# Altium footprint library SAWACO.PcbLib: 45 footprints (part 3 of 3)
Each footprint in its own frame and in the unit in brackets; x right, y up, seen from the top. Pads: shape width x height; smd on the part's side, far side on the other; paste and mask are expansions set on the pad; w line width, h text height; cw(c..) or ccw(c..) is an arc to the next point about the centre after c.
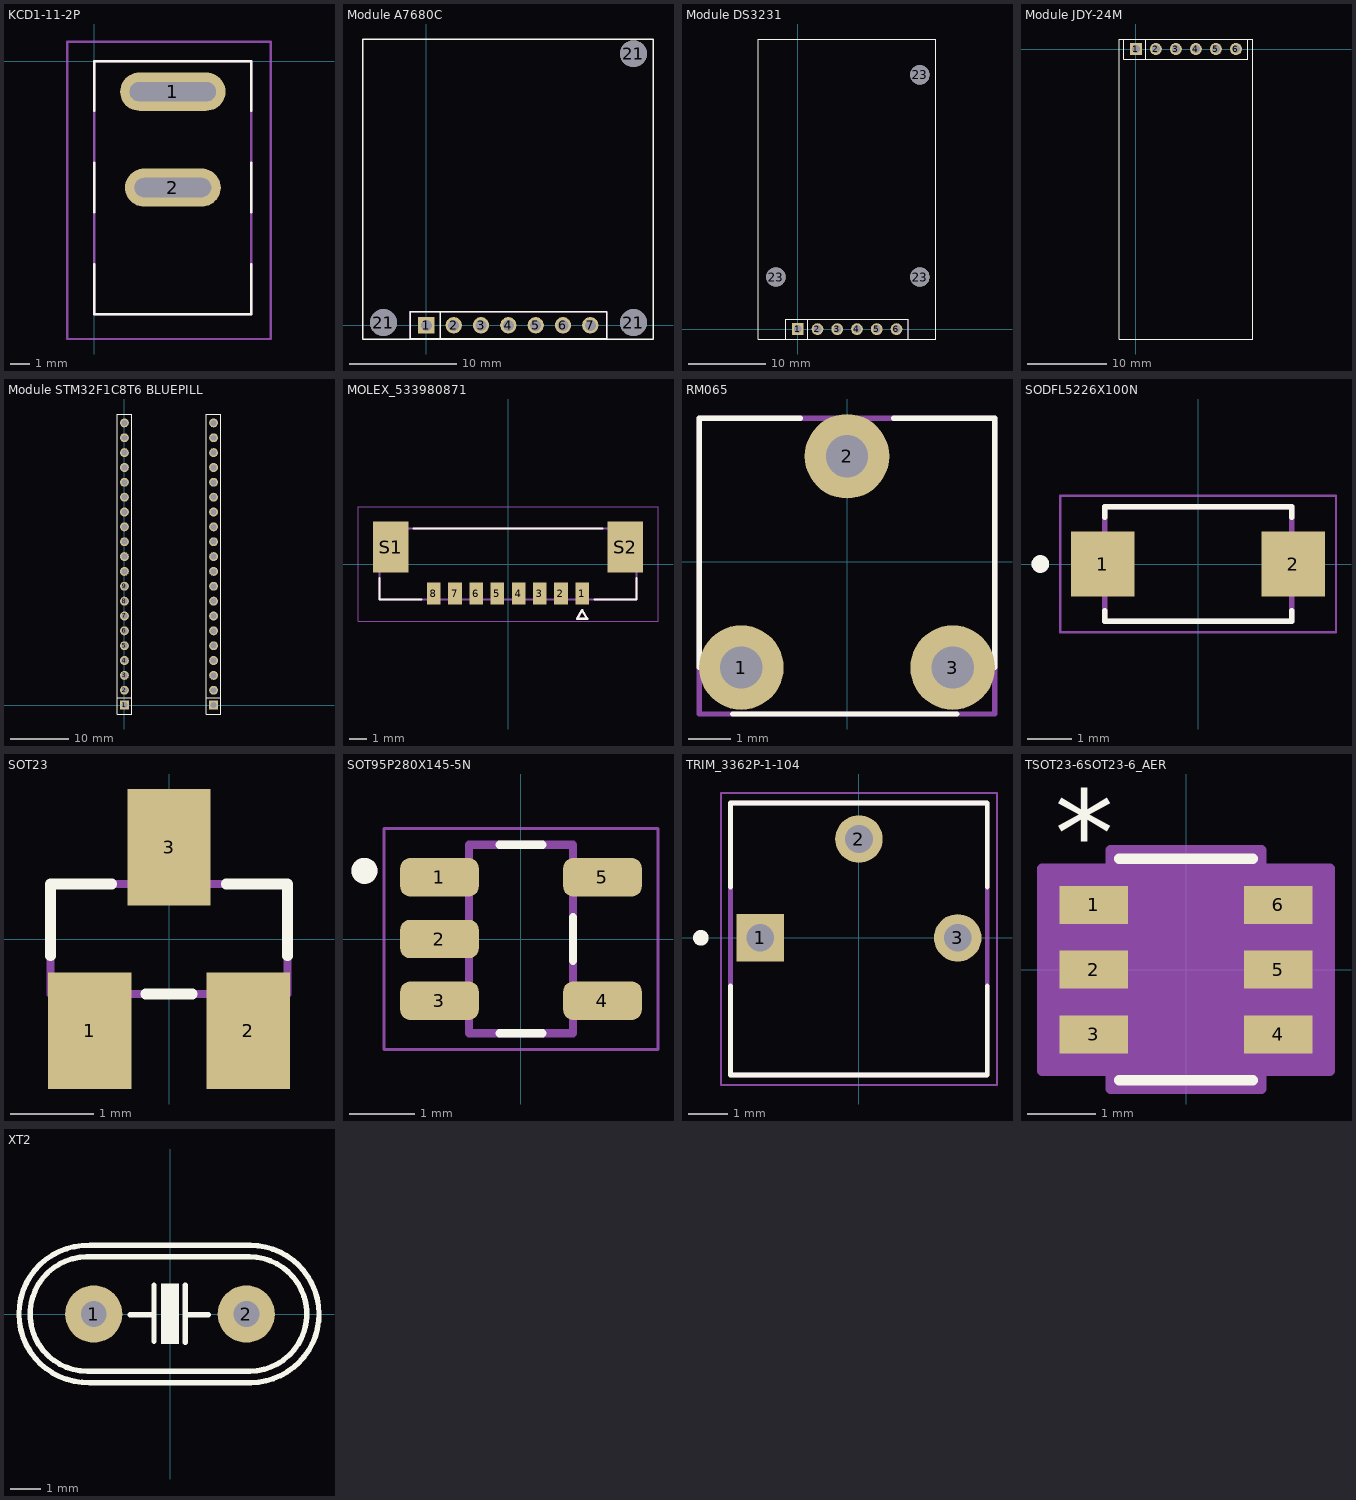
[diagram p2: the footprints below, top view; thin cyan lines are the x and y axes]

## KCD1-11-2P [mm] "KCD1-11 power switch"
pads (2):
  oval 5.5x2 hole 1 slot 4.5 at 0 deg: 1(4.1,-1.6)
  oval 5x2 hole 1 slot 4 at 0 deg: 2(4.1,-6.6)
Top Overlay:
  lines w0.127: 0,-10.6 0,-13.2 8.2,-13.2 8.2,-10.6 ; 0,-7.9 0,-5.3 ; 0,-2.6 0,0 8.2,0 8.2,-2.6 ; 8.2,-7.9 8.2,-5.3
Mechanical 13:
  lines w0.127: 0,-13.2 8.2,-13.2 8.2,0 0,0 0,-13.2
Mechanical 15:
  lines w0.127: -1.4,-14.5 9.2,-14.5 9.2,1 -1.4,1 -1.4,-14.5
3D body "KCD1-11.step": height 14.5, standoff -5, extent -1.3,-14.5 9.1,1

## Module A7680C [mm] "Footprint for A7680C"
height 8.5
pads (10):
  rect 1.52x1.52 hole 1.02: 1(0,0)
  round 1.52 hole 1.02: 2(2.54,0) 3(5.08,0) 4(7.62,0) 5(10.16,0) 6(12.7,0) 7(15.24,0)
  round 2.5 hole 2.5: 21(-4,0.25) 21(19.25,0.25) 21(19.25,25.25)
Top Overlay:
  lines w0.127: -1.524,-1.27 16.764,-1.27 16.764,1.27 -1.524,1.27 ; -1.52,-1.27 -1.52,1.27 ; 1.27,-1.27 1.27,1.27 ; -5.898,-1.275 21.075,-1.275 21.075,26.618 -5.898,26.618 -5.898,-1.275
Mechanical 15:
  lines w0.127: -1.524,-1.27 -1.524,1.27 16.764,1.27 16.764,-1.27 -1.524,-1.27
3D body "Module A7680C THUDUC No-Volte v6.step": height 12.01, standoff 0.47, extent -5.875,-1.275 21.125,26.725

## Module DS3231 [mm]
height 8.5
pads (9):
  rect 1.52x1.52 hole 1.02: 1(0,0)
  round 1.52 hole 1.02: 2(2.54,0) 3(5.08,0) 4(7.62,0) 5(10.16,0) 6(12.7,0)
  round 2.5 hole 2.5: 23(-2.8,6.7) 23(15.7,6.7) 23(15.7,32.7)
Top Overlay:
  lines w0.127: -1.524,-1.27 14.224,-1.27 14.224,1.27 ; -1.524,1.27 14.224,1.27 ; -1.52,-1.27 -1.52,1.27 ; 1.27,-1.27 1.27,1.27 ; 14.224,0.762 14.224,1.27 ; -5.055,-1.27 17.729,-1.27 17.729,37.313 -5.055,37.313 -5.055,-1.27
Mechanical 15:
  lines w0.127: -1.524,-1.27 -1.524,1.27 14.224,1.27 14.224,-1.27 -1.524,-1.27
3D body "DS3231 RTC v2.step": height 17.41, standoff -0.54, extent -5.05,-1.3 17.75,37.3

## Module JDY-24M [mm]
height 8.5
pads (6):
  rect 1.52x1.52 hole 1.02: 1(0,0)
  round 1.52 hole 1.02: 2(2.54,0) 3(5.08,0) 4(7.62,0) 5(10.16,0) 6(12.7,0)
Top Overlay:
  lines w0.127: -1.524,-1.27 14.224,-1.27 14.224,1.27 ; -1.524,1.27 14.224,1.27 ; -1.52,-1.27 -1.52,1.27 ; 1.27,-1.27 1.27,1.27 ; 14.224,0.762 14.224,1.27 ; -2.083,-36.779 14.808,-36.779 14.808,1.245 -2.083,1.245 -2.083,-36.779
Mechanical 15:
  lines w0.127: -1.524,-1.27 -1.524,1.27 14.224,1.27 14.224,-1.27 -1.524,-1.27
3D body "JDY-24M v2.step": height 12.6, standoff -0.09, extent -2.08,-36.755 14.8,1.245

## Module STM32F1C8T6 BLUEPILL [mm] "stm32f1 Bluepill"
pads (40):
  rect 1.52x1.52 hole 1.02: 1(0,0) 21(15.24,0)
  round 1.52 hole 1.02: 2(0,2.54) 3(0,5.08) 4(0,7.62) 5(0,10.16) 6(0,12.7) 7(0,15.24) 8(0,17.78) 9(0,20.32) 10(0,22.86) 11(0,25.4) 12(0,27.94) 13(0,30.48) 14(0,33.02) 15(0,35.56) 16(0,38.1) 17(0,40.64) 18(0,43.18) 19(0,45.72) 20(0,48.26) 22(15.24,2.54) 23(15.24,5.08) 24(15.24,7.62) 25(15.24,10.16) 26(15.24,12.7) 27(15.24,15.24) 28(15.24,17.78) 29(15.24,20.32) 30(15.24,22.86) 31(15.24,25.4) 32(15.24,27.94) 33(15.24,30.48) 34(15.24,33.02) 35(15.24,35.56) 36(15.24,38.1) 37(15.24,40.64) 38(15.24,43.18) 39(15.24,45.72) 40(15.24,48.26)
Top Overlay:
  lines w0.127: -1.27,1.27 1.27,1.27 ; 13.97,1.27 16.51,1.27 ; -1.27,-1.52 1.27,-1.52 1.27,49.78 -1.27,49.78 -1.27,0.635 -1.27,-1.52 ; 13.97,-1.52 16.51,-1.52 16.51,49.78 13.97,49.78 13.97,0.635 13.97,-1.52
3D body "61302011821.stp": height 8.51, standoff -3.09, extent -1.25,-1.52 1.25,49.78
3D body "61302011821.stp": height 8.51, standoff -3.09, extent 13.99,-1.52 16.49,49.78
3D body "STM32F103C8T6_Blue_Pill v6.step": height 20.77, standoff 2.5, extent -3.86,-5.87 19,51.69

## MOLEX_533980871 [mm]
height 4.7
pads (10):
  rect 0.8x1.3 smd mask+0.076: 1(4.375,-1.75) 2(3.125,-1.75) 3(1.875,-1.75) 4(0.625,-1.75) 5(-0.625,-1.75) 6(-1.875,-1.75) 7(-3.125,-1.75) 8(-4.375,-1.75)
  rect 2.1x3 smd mask+0.076: S1(-6.925,1) S2(6.925,1)
Top Overlay:
  lines w0.127: -7.575,-0.82 -7.575,-2.1 -5.095,-2.1 ; -5.555,2.1 5.555,2.1 ; 5.095,-2.1 7.575,-2.1 7.575,-0.82 ; 4.075,-3.23 4.675,-3.23 4.375,-2.73 4.075,-3.23
Mechanical 13:
  lines w0.127: -7.575,-2.1 7.575,-2.1 7.575,2.1 -7.575,2.1 -7.575,-2.1 ; 4.075,-3.23 4.675,-3.23 4.375,-2.73 4.075,-3.23
Mechanical 15:
  lines w0.05: -8.845,-3.37 -8.845,3.37 8.845,3.37 8.845,-3.37 -8.845,-3.37

## RM065 [mm]
pads (3):
  round 2 hole 1: 1(-2.5,-2.5) 2(0,2.5) 3(2.5,-2.5)
Top Overlay:
  lines w0.127: -3.5,-2.5 -3.5,3.4 -1.1,3.4 ; -2.7,-3.6 2.6,-3.6 ; 1.1,3.4 3.5,3.4 3.5,-2.5
Mechanical 13:
  lines w0.127: -3.5,-3.6 3.5,-3.6 3.5,3.4 -1.1,3.4 -3.5,3.4 -3.5,-3.6

## SODFL5226X100N [mm]
pads (2):
  rect 1.44x1.48 smd: 1(-2.165,0) 2(2.165,0)
Top Overlay:
  circle w0.2: c-3.585,0 r0.1
  lines w0.127: -2.125,-1.06 -2.125,-1.3 2.125,-1.3 2.125,-1.06 ; -2.125,1.06 -2.125,1.3 2.125,1.3 2.125,1.06
Mechanical 13:
  circle w0.2: c-3.585,0 r0.1
  lines w0.127: -2.125,-1.3 2.125,-1.3 2.125,1.3 -2.125,1.3 -2.125,-1.3
Mechanical 15:
  lines w0.05: -3.135,-1.55 3.135,-1.55 3.135,1.55 -3.135,1.55 -3.135,-1.55
3D body "step_temp.STEP": height 1, standoff 0, extent -2.6,-1.3 2.6,1.299

## SOT23 [mm]
pads (3):
  rect 1x1.4 smd: 1(-0.95,-1.1) 2(0.95,-1.1) 3(0,1.1)
Top Overlay:
  lines w0.127: -1.422,-0.203 -1.422,0.66 -0.686,0.66 ; -0.279,-0.66 0.279,-0.66 ; 0.686,0.66 1.422,0.66 1.422,-0.203
Mechanical 13:
  region: 0.229,0.711 -0.229,0.711 -0.229,1.295 0.229,1.295
  region: 1.168,-1.295 0.711,-1.295 0.711,-0.711 1.168,-0.711
  region: -0.711,-1.295 -1.168,-1.295 -1.168,-0.711 -0.711,-0.711
  lines w0.1: -1.422,-0.66 1.422,-0.66 1.422,0.66 -1.422,0.66 -1.422,-0.66
3D body "step_temp.STEP": height 1.25, standoff 0, extent -1.45,-1.4 1.45,1.4

## SOT95P280X145-5N [mm]
pads (5):
  rrect50% 1.21x0.59 smd: 1(-1.255,0.95) 2(-1.255,0) 3(-1.255,-0.95) 4(1.255,-0.95) 5(1.255,0.95)
Top Overlay:
  circle w0.2: c-2.41,1.05 r0.1
  lines w0.127: -0.33,-1.45 0.33,-1.45 ; -0.33,1.45 0.33,1.45 ; 0.8,-0.335 0.8,0.335
Mechanical 13:
  circle w0.2: c-2.41,1.05 r0.1
  lines w0.127: -0.8,-1.45 0.8,-1.45 0.8,1.45 -0.8,1.45 -0.8,-1.45
Mechanical 15:
  lines w0.05: -2.11,-1.7 -2.11,1.7 2.11,1.7 2.11,-1.7 -2.11,-1.7

## TRIM_3362P-1-104 [mil]
pads (3):
  rect 48.11x48.11 hole 28.11: 1(-100,0)
  round 48.11 hole 28.11: 2(0,100) 3(100,0)
Top Overlay:
  circle w7.87: c-160,0 r3.94
  lines w5: -129.92,-138.98 129.92,-138.98 ; -129.92,-138.58 -129.92,-48.62 ; -129.92,51.38 -129.92,136.61 129.92,136.61 129.92,51.38 ; 129.92,-138.58 129.92,-48.62
Mechanical 13:
  lines w5: -129.92,-138.98 129.92,-138.98 129.92,136.61 -129.92,136.61 -129.92,-138.98
Mechanical 15:
  lines w1.97: -139.76,-148.82 139.76,-148.82 139.76,146.46 -139.76,146.46 -139.76,-148.82

## TSOT23-6SOT23-6_AER [mil]
pads (6):
  rect 39.5x22 smd paste+0 mask+0: 1(-53.25,37.4) 2(-53.25,0) 3(-53.25,-37.4) 4(53.25,-37.4) 5(53.25,0) 6(53.25,37.4)
Top Overlay:
  lines w6: -38.5,-64 38.5,-64 ; -38.5,64 38.5,64
  text "*" at -75.75,54.4 h50
Mechanical 13:
  lines w0: -12,59 ccw(c0,59) 12,59
  lines w1: -59,-47.4 -59,-27.4 -33.5,-27.4 -33.5,-47.4 -59,-47.4 ; -59,-10 -59,10 -33.5,10 -33.5,-10 -59,-10 ; -59,27.4 -59,47.4 -33.5,47.4 -33.5,27.4 -59,27.4 ; -33.5,-59 33.5,-59 33.5,59 -33.5,59 -33.5,-59 ; 33.5,-47.4 33.5,-27.4 59,-27.4 59,-47.4 33.5,-47.4 ; 33.5,-10 33.5,10 59,10 59,-10 33.5,-10 ; 33.5,27.4 33.5,47.4 59,47.4 59,27.4 33.5,27.4
  text "*" at -31,6 h50
Mechanical 15:
  region: -43.5,-58.4 -83,-58.4 -83,58.4 -43.5,58.4 -43.5,69 43.5,69 43.5,58.4 83,58.4 83,-58.4 43.5,-58.4 43.5,-69 -43.5,-69
  lines w6: -83,-58.4 -83,58.4 -43.5,58.4 -43.5,69 43.5,69 43.5,58.4 83,58.4 83,-58.4 43.5,-58.4 43.5,-69 -43.5,-69 -43.5,-58.4 -83,-58.4
3D body "TSOT23-6SOT23-6_AER.step": height 57.09, standoff 0, extent -59.02,-59.02 59.02,59.02

## XT2 [mil] "Footpin for Crystal 2 pin"
pads (2):
  round 75 hole 34: 1(-100,0) 2(100,0)
Top Overlay:
  region: 11.5,40 11.5,-39 -11.5,-39 -11.5,40
  lines w7: -109,75 ccw(c-108.5,0) -108.27,-75 ; -106.97,-75 103.03,-75 ; -105.97,75 104.03,75 ; -105.02,-90 105.91,-90 ccw(c105.31,0) 105.03,90 -104.97,90.01 ccw(c-108,0.06) -105.02,-89.89 ; -52,-1 -21,-1 ; -21,-36 -21,38 ; 20,-37 20,38 ; 20,-1 50,-1 ; 104,75 cw(c104.23,0) 104.73,-75
3D body "SW3dPS-HP49US.STEP": height 137.8, standoff -157.48, extent -233.43,-93.07 213.43,90